# Altium integrated library Integrated_Library.IntLib: 173 symbols (part 1 of 2) (continued)
## TMS320F28335_2 (continued)
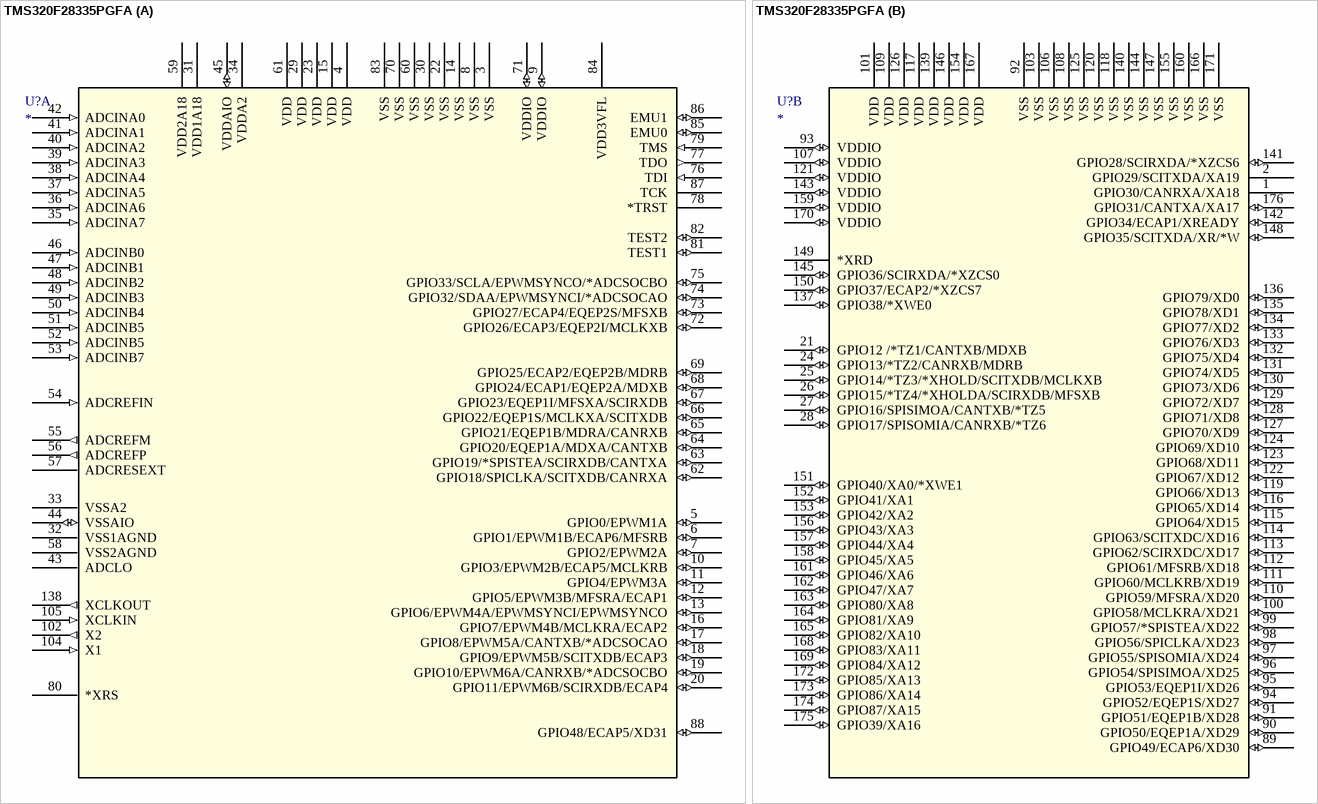
[diagram p13: symbol TMS320F28335PGFA]
text: TMS320F28335

## TMS320F28335PGFA
designator U?
Imported; Manufacturer_Part_Number: TMS320F28335PGFA; Vendor: Texas Instruments; Section: Microcontroller and Processor; C: Copyright (C) 2015 Accelerated Designs. All rights reserved; Family: Microcontroller; Manufacturer_Name: Texas Instruments; Copyright: Copyright (C) 2015 Accelerated Designs. All rights reserved; RS_Part_Number: 6606654; Value: Value; Type: Type; RefDes: RefDes
footprint PGF176
part A pins: 3 VSS (power), 4 VDD (power), 5 GPIO0/EPWM1A (io), 6 GPIO1/EPWM1B/ECAP6/MFSRB (io), 7 GPIO2/EPWM2A (io), 8 VSS (power), 9 VDDIO (io), 10 GPIO3/EPWM2B/ECAP5/MCLKRB (io), 11 GPIO4/EPWM3A (io), 12 GPIO5/EPWM3B/MFSRA/ECAP1 (io), 13 GPIO6/EPWM4A/EPWMSYNCI/EPWMSYNCO (io), 14 VSS (power), 15 VDD (power), 16 GPIO7/EPWM4B/MCLKRA/ECAP2 (io), 17 GPIO8/EPWM5A/CANTXB/*ADCSOCAO (io), 18 GPIO9/EPWM5B/SCITXDB/ECAP3 (io), 19 GPIO10/EPWM6A/CANRXB/*ADCSOCBO (io), 20 GPIO11/EPWM6B/SCIRXDB/ECAP4 (io), 22 VSS (power), 23 VDD (power), 29 VDD (power), 30 VSS (power), 31 VDD1A18 (power), 32 VSS1AGND (power), 33 VSSA2 (power), 34 VDDA2 (power), 35 ADCINA7 (in), 36 ADCINA6 (in), 37 ADCINA5 (in), 38 ADCINA4 (in), 39 ADCINA3 (in), 40 ADCINA2 (in), 41 ADCINA1 (in), 42 ADCINA0 (in), 43 ADCLO, 44 VSSAIO (io), 45 VDDAIO (io), 46 ADCINB0 (in), 47 ADCINB1 (in), 48 ADCINB2 (in), 49 ADCINB3 (in), 50 ADCINB4 (in), 51 ADCINB5 (in), 52 ADCINB5 (in), 53 ADCINB7 (in), 54 ADCREFIN (in), 55 ADCREFM (out), 56 ADCREFP (out), 57 ADCRESEXT, 58 VSS2AGND (power), 59 VDD2A18 (power), 60 VSS (power), 61 VDD (power), 62 GPIO18/SPICLKA/SCITXDB/CANRXA (io), 63 GPIO19/*SPISTEA/SCIRXDB/CANTXA (io), 64 GPIO20/EQEP1A/MDXA/CANTXB (io), 65 GPIO21/EQEP1B/MDRA/CANRXB (io), 66 GPIO22/EQEP1S/MCLKXA/SCITXDB (io), 67 GPIO23/EQEP1I/MFSXA/SCIRXDB (io), 68 GPIO24/ECAP1/EQEP2A/MDXB (io), 69 GPIO25/ECAP2/EQEP2B/MDRB (io), 70 VSS (power), 71 VDDIO (io), 72 GPIO26/ECAP3/EQEP2I/MCLKXB (io), 73 GPIO27/ECAP4/EQEP2S/MFSXB (io), 74 GPIO32/SDAA/EPWMSYNCI/*ADCSOCAO (io), 75 GPIO33/SCLA/EPWMSYNCO/*ADCSOCBO (io), 76 TDI (in), 77 TDO (out), 78 *TRST, 79 TMS (in), 80 *XRS, 81 TEST1 (io), 82 TEST2 (io), 83 VSS (power), 84 VDD3VFL (power), 85 EMU0 (io), 86 EMU1 (io), 87 TCK, 88 GPIO48/ECAP5/XD31 (io), 102 X2 (out), 104 X1 (in), 105 XCLKIN (in), 138 XCLKOUT (out)
part B pins: 1 GPIO30/CANRXA/XA18, 2 GPIO29/SCITXDA/XA19, 21 GPIO12 /*TZ1/CANTXB/MDXB (io), 24 GPIO13/*TZ2/CANRXB/MDRB (io), 25 GPIO14/*TZ3/*XHOLD/SCITXDB/MCLKXB (io), 26 GPIO15/*TZ4/*XHOLDA/SCIRXDB/MFSXB (io), 27 GPIO16/SPISIMOA/CANTXB/*TZ5 (io), 28 GPIO17/SPISOMIA/CANRXB/*TZ6 (io), 89 GPIO49/ECAP6/XD30 (io), 90 GPIO50/EQEP1A/XD29 (io), 91 GPIO51/EQEP1B/XD28 (io), 92 VSS (power), 93 VDDIO (io), 94 GPIO52/EQEP1S/XD27 (io), 95 GPIO53/EQEP1I/XD26 (io), 96 GPIO54/SPISIMOA/XD25 (io), 97 GPIO55/SPISOMIA/XD24 (io), 98 GPIO56/SPICLKA/XD23 (io), 99 GPIO57/*SPISTEA/XD22 (io), 100 GPIO58/MCLKRA/XD21 (io), 101 VDD (power), 103 VSS (power), 106 VSS (power), 107 VDDIO (io), 108 VSS (power), 109 VDD (power), 110 GPIO59/MFSRA/XD20 (io), 111 GPIO60/MCLKRB/XD19 (io), 112 GPIO61/MFSRB/XD18 (io), 113 GPIO62/SCIRXDC/XD17 (io), 114 GPIO63/SCITXDC/XD16 (io), 115 GPIO64/XD15 (io), 116 GPIO65/XD14 (io), 117 VDD (power), 118 VSS (power), 119 GPIO66/XD13 (io), 120 VSS (power), 121 VDDIO (io), 122 GPIO67/XD12 (io), 123 GPIO68/XD11 (io), 124 GPIO69/XD10 (io), 125 VSS (power), 126 VDD (power), 127 GPIO70/XD9 (io), 128 GPIO71/XD8 (io), 129 GPIO72/XD7 (io), 130 GPIO73/XD6 (io), 131 GPIO74/XD5 (io), 132 GPIO75/XD4 (io), 133 GPIO76/XD3 (io), 134 GPIO77/XD2 (io), 135 GPIO78/XD1 (io), 136 GPIO79/XD0 (io), 137 GPIO38/*XWE0 (io), 139 VDD (power), 140 VSS (power), 141 GPIO28/SCIRXDA/*XZCS6 (io), 142 GPIO34/ECAP1/XREADY (io), 143 VDDIO (io), 144 VSS (power), 145 GPIO36/SCIRXDA/*XZCS0 (io), 146 VDD (power), 147 VSS (power), 148 GPIO35/SCITXDA/XR/*W (io), 149 *XRD, 150 GPIO37/ECAP2/*XZCS7 (io), 151 GPIO40/XA0/*XWE1 (io), 152 GPIO41/XA1 (io), 153 GPIO42/XA2 (io), 154 VDD (power), 155 VSS (power), 156 GPIO43/XA3 (io), 157 GPIO44/XA4 (io), 158 GPIO45/XA5 (io), 159 VDDIO (io), 160 VSS (power), 161 GPIO46/XA6 (io), 162 GPIO47/XA7 (io), 163 GPIO80/XA8 (io), 164 GPIO81/XA9 (io), 165 GPIO82/XA10 (io), 166 VSS (power), 167 VDD (power), 168 GPIO83/XA11 (io), 169 GPIO84/XA12 (io), 170 VDDIO (io), 171 VSS (power), 172 GPIO85/XA13 (io), 173 GPIO86/XA14 (io), 174 GPIO87/XA15 (io), 175 GPIO39/XA16 (io), 176 GPIO31/CANTXA/XA17 (io)

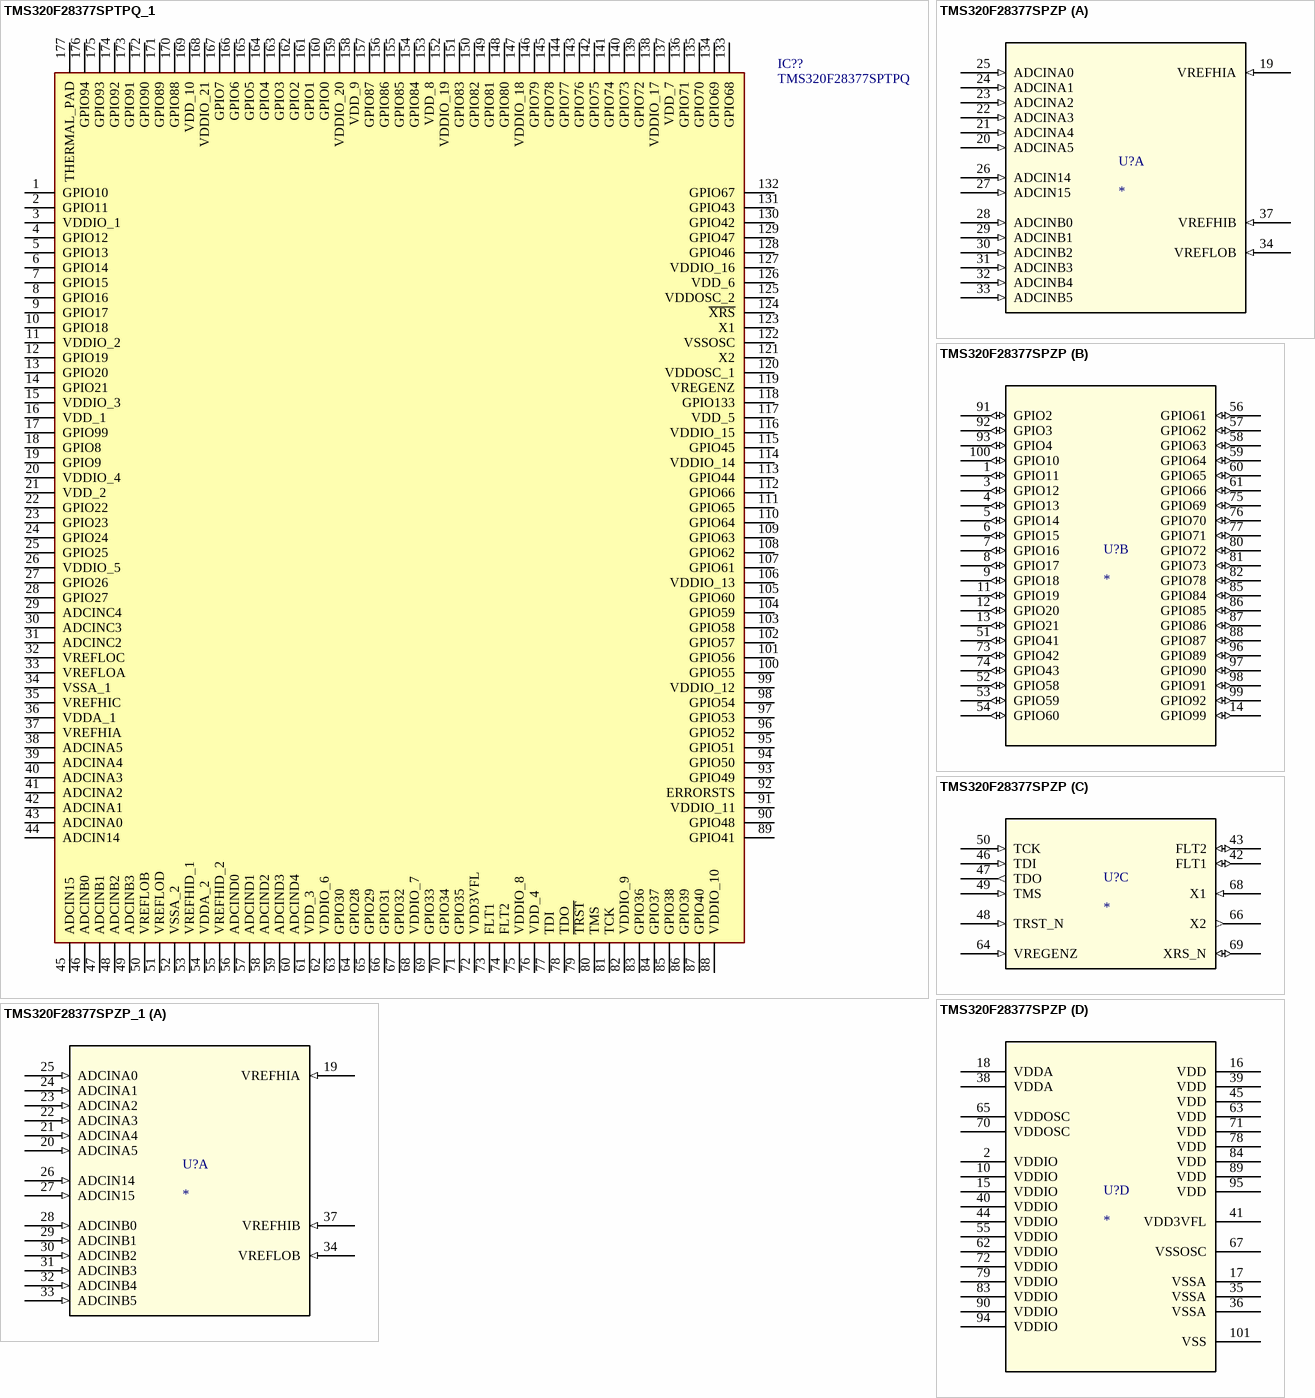
[diagram p14: symbols TMS320F28377SPTPQ_1 to TMS320F28377SPZP_1]

## TMS320F28377SPTPQ_1
designator IC??, comment TMS320F28377SPTPQ
Integrated Circuit; Manufacturer_Name: Texas Instruments; Datasheet Link: http://www.tij.co.jp/jp/lit/ds/symlink/tms320f28377s.pdf; Height: 1.45mm; Mouser2 Part Number: 595-320F28377SPTPQ; Mouser2 Price/Stock: https://www.mouser.com/Search/Refine.aspx?Keyword=595-320F28377SPTPQ; Manufacturer_Part_Number: TMS320F28377SPTPQ
footprint QFP50P2600X2600X145-177N
pins: 1 GPIO10, 2 GPIO11, 3 VDDIO_1, 4 GPIO12, 5 GPIO13, 6 GPIO14, 7 GPIO15, 8 GPIO16, 9 GPIO17, 10 GPIO18, 11 VDDIO_2, 12 GPIO19, 13 GPIO20, 14 GPIO21, 15 VDDIO_3, 16 VDD_1, 17 GPIO99, 18 GPIO8, 19 GPIO9, 20 VDDIO_4, 21 VDD_2, 22 GPIO22, 23 GPIO23, 24 GPIO24, 25 GPIO25, 26 VDDIO_5, 27 GPIO26, 28 GPIO27, 29 ADCINC4, 30 ADCINC3, 31 ADCINC2, 32 VREFLOC, 33 VREFLOA, 34 VSSA_1, 35 VREFHIC, 36 VDDA_1, 37 VREFHIA, 38 ADCINA5, 39 ADCINA4, 40 ADCINA3, 41 ADCINA2, 42 ADCINA1, 43 ADCINA0, 44 ADCIN14, 45 ADCIN15, 46 ADCINB0, 47 ADCINB1, 48 ADCINB2, 49 ADCINB3, 50 VREFLOB, 51 VREFLOD, 52 VSSA_2, 53 VREFHID_1, 54 VDDA_2, 55 VREFHID_2, 56 ADCIND0, 57 ADCIND1, 58 ADCIND2, 59 ADCIND3, 60 ADCIND4, 61 VDD_3, 62 VDDIO_6, 63 GPIO30, 64 GPIO28, 65 GPIO29, 66 GPIO31, 67 GPIO32, 68 VDDIO_7, 69 GPIO33, 70 GPIO34, 71 GPIO35, 72 VDD3VFL, 73 FLT1, 74 FLT2, 75 VDDIO_8, 76 VDD_4, 77 TDI, 78 TDO, 79 ~{TRST}, 80 TMS, 81 TCK, 82 VDDIO_9, 83 GPIO36, 84 GPIO37, 85 GPIO38, 86 GPIO39, 87 GPIO40, 88 VDDIO_10, 89 GPIO41, 90 GPIO48, 91 VDDIO_11, 92 ERRORSTS, 93 GPIO49, 94 GPIO50, 95 GPIO51, 96 GPIO52, 97 GPIO53, 98 GPIO54, 99 VDDIO_12, 100 GPIO55, 101 GPIO56, 102 GPIO57, 103 GPIO58, 104 GPIO59, 105 GPIO60, 106 VDDIO_13, 107 GPIO61, 108 GPIO62, 109 GPIO63, 110 GPIO64, 111 GPIO65, 112 GPIO66, 113 GPIO44, 114 VDDIO_14, 115 GPIO45, 116 VDDIO_15, 117 VDD_5, 118 GPIO133, 119 VREGENZ, 120 VDDOSC_1, 121 X2, 122 VSSOSC, 123 X1, 124 ~{XRS}, 125 VDDOSC_2, 126 VDD_6, 127 VDDIO_16, 128 GPIO46, 129 GPIO47, 130 GPIO42, 131 GPIO43, 132 GPIO67, 133 GPIO68, 134 GPIO69, 135 GPIO70, 136 GPIO71, 137 VDD_7, 138 VDDIO_17, 139 GPIO72, 140 GPIO73, 141 GPIO74, 142 GPIO75, 143 GPIO76, 144 GPIO77, 145 GPIO78, 146 GPIO79, 147 VDDIO_18, 148 GPIO80, 149 GPIO81, 150 GPIO82, 151 GPIO83, 152 VDDIO_19, 153 VDD_8, 154 GPIO84, 155 GPIO85, 156 GPIO86, 157 GPIO87, 158 VDD_9, 159 VDDIO_20, 160 GPIO0, 161 GPIO1, 162 GPIO2, 163 GPIO3, 164 GPIO4, 165 GPIO5, 166 GPIO6, 167 GPIO7, 168 VDDIO_21, 169 VDD_10, 170 GPIO88, 171 GPIO89, 172 GPIO90, 173 GPIO91, 174 GPIO92, 175 GPIO93, 176 GPIO94, 177 THERMAL_PAD

## TMS320F28377SPZP
designator U?
Imported; PartNumber: TMS320F28377SPZPQ; Alternate_PartNumber: TMS320F28377SPZPT; Manufacturer: Texas Instruments; CompType: IC; PIN_COUNT: 101; Application_BuildNumber: *; PackageReference: PZP0100N; MountType: SMT; RoHS: Y; RefDes: RefDes; TYPE: TYPE; Value: Value
footprint TSQFP50P1540X1540X120_HS-101N (TSQFP, 100-Leads, Body 14.00x14.00mm, Pitch 0.50mm, Thermal Pad 8.64x8.64mm, IPC Medium Density)
part A pins: 19 VREFHIA (in), 20 ADCINA5 (in), 21 ADCINA4 (in), 22 ADCINA3 (in), 23 ADCINA2 (in), 24 ADCINA1 (in), 25 ADCINA0 (in), 26 ADCIN14 (in), 27 ADCIN15 (in), 28 ADCINB0 (in), 29 ADCINB1 (in), 30 ADCINB2 (in), 31 ADCINB3 (in), 32 ADCINB4 (in), 33 ADCINB5 (in), 34 VREFLOB (in), 37 VREFHIB (in)
part B pins: 1 GPIO11 (io), 3 GPIO12 (io), 4 GPIO13 (io), 5 GPIO14 (io), 6 GPIO15 (io), 7 GPIO16 (io), 8 GPIO17 (io), 9 GPIO18 (io), 11 GPIO19 (io), 12 GPIO20 (io), 13 GPIO21 (io), 14 GPIO99 (io), 51 GPIO41 (io), 52 GPIO58 (io), 53 GPIO59 (io), 54 GPIO60 (io), 56 GPIO61 (io), 57 GPIO62 (io), 58 GPIO63 (io), 59 GPIO64 (io), 60 GPIO65 (io), 61 GPIO66 (io), 73 GPIO42 (io), 74 GPIO43 (io), 75 GPIO69 (io), 76 GPIO70 (io), 77 GPIO71 (io), 80 GPIO72 (io), 81 GPIO73 (io), 82 GPIO78 (io), 85 GPIO84 (io), 86 GPIO85 (io), 87 GPIO86 (io), 88 GPIO87 (io), 91 GPIO2 (io), 92 GPIO3 (io), 93 GPIO4 (io), 96 GPIO89 (io), 97 GPIO90 (io), 98 GPIO91 (io), 99 GPIO92 (io), 100 GPIO10 (io)
part C pins: 42 FLT1 (io), 43 FLT2 (io), 46 TDI (in), 47 TDO (out), 48 TRST_N (in), 49 TMS (in), 50 TCK (in), 64 VREGENZ (in), 66 X2 (out), 68 X1 (in), 69 XRS_N (io)
part D pins: 2 VDDIO (power), 10 VDDIO (power), 15 VDDIO (power), 16 VDD (power), 17 VSSA (power), 18 VDDA (power), 35 VSSA (power), 36 VSSA (power), 38 VDDA (power), 39 VDD (power), 40 VDDIO (power), 41 VDD3VFL (power), 44 VDDIO (power), 45 VDD (power), 55 VDDIO (power), 62 VDDIO (power), 63 VDD (power), 65 VDDOSC (power), 67 VSSOSC (power), 70 VDDOSC (power), 71 VDD (power), 72 VDDIO (power), 78 VDD (power), 79 VDDIO (power), 83 VDDIO (power), 84 VDD (power), 89 VDD (power), 90 VDDIO (power), 94 VDDIO (power), 95 VDD (power), 101 VSS (power)

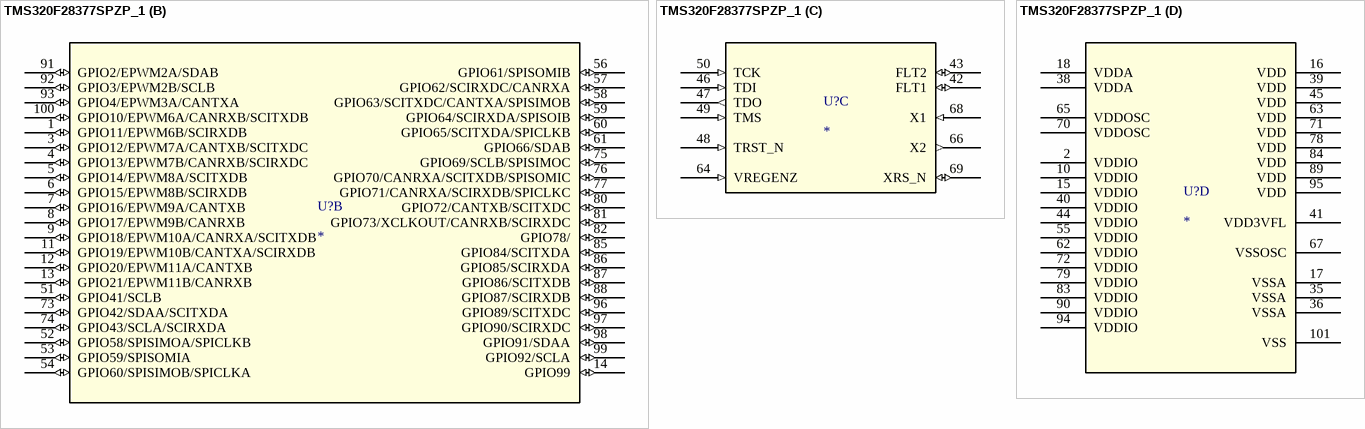
[diagram p15: symbol TMS320F28377SPZP_1]

## TMS320F28377SPZP_1
designator U?
Imported; PartNumber: TMS320F28377SPZPQ; Alternate_PartNumber: TMS320F28377SPZPT; Manufacturer: Texas Instruments; CompType: IC; PIN_COUNT: 101; Application_BuildNumber: *; PackageReference: PZP0100N; MountType: SMT; RoHS: Y; RefDes: RefDes; TYPE: TYPE; Value: Value
footprint TSQFP50P1540X1540X120_HS-101N (TSQFP, 100-Leads, Body 14.00x14.00mm, Pitch 0.50mm, Thermal Pad 8.64x8.64mm, IPC Medium Density)
part A pins: 19 VREFHIA (in), 20 ADCINA5 (in), 21 ADCINA4 (in), 22 ADCINA3 (in), 23 ADCINA2 (in), 24 ADCINA1 (in), 25 ADCINA0 (in), 26 ADCIN14 (in), 27 ADCIN15 (in), 28 ADCINB0 (in), 29 ADCINB1 (in), 30 ADCINB2 (in), 31 ADCINB3 (in), 32 ADCINB4 (in), 33 ADCINB5 (in), 34 VREFLOB (in), 37 VREFHIB (in)
part B pins: 1 GPIO11/EPWM6B/SCIRXDB (io), 3 GPIO12/EPWM7A/CANTXB/SCITXDC (io), 4 GPIO13/EPWM7B/CANRXB/SCIRXDC (io), 5 GPIO14/EPWM8A/SCITXDB (io), 6 GPIO15/EPWM8B/SCIRXDB (io), 7 GPIO16/EPWM9A/CANTXB (io), 8 GPIO17/EPWM9B/CANRXB (io), 9 GPIO18/EPWM10A/CANRXA/SCITXDB (io), 11 GPIO19/EPWM10B/CANTXA/SCIRXDB (io), 12 GPIO20/EPWM11A/CANTXB (io), 13 GPIO21/EPWM11B/CANRXB (io), 14 GPIO99 (io), 51 GPIO41/SCLB (io), 52 GPIO58/SPISIMOA/SPICLKB (io), 53 GPIO59/SPISOMIA (io), 54 GPIO60/SPISIMOB/SPICLKA (io), 56 GPIO61/SPISOMIB (io), 57 GPIO62/SCIRXDC/CANRXA (io), 58 GPIO63/SCITXDC/CANTXA/SPISIMOB (io), 59 GPIO64/SCIRXDA/SPISOIB (io), 60 GPIO65/SCITXDA/SPICLKB (io), 61 GPIO66/SDAB (io), 73 GPIO42/SDAA/SCITXDA (io), 74 GPIO43/SCLA/SCIRXDA (io), 75 GPIO69/SCLB/SPISIMOC (io), 76 GPIO70/CANRXA/SCITXDB/SPISOMIC (io), 77 GPIO71/CANRXA/SCIRXDB/SPICLKC (io), 80 GPIO72/CANTXB/SCITXDC (io), 81 GPIO73/XCLKOUT/CANRXB/SCIRXDC (io), 82 GPIO78/ (io), 85 GPIO84/SCITXDA (io), 86 GPIO85/SCIRXDA (io), 87 GPIO86/SCITXDB (io), 88 GPIO87/SCIRXDB (io), 91 GPIO2/EPWM2A/SDAB (io), 92 GPIO3/EPWM2B/SCLB (io), 93 GPIO4/EPWM3A/CANTXA (io), 96 GPIO89/SCITXDC (io), 97 GPIO90/SCIRXDC (io), 98 GPIO91/SDAA (io), 99 GPIO92/SCLA (io), 100 GPIO10/EPWM6A/CANRXB/SCITXDB (io)
part C pins: 42 FLT1 (io), 43 FLT2 (io), 46 TDI (in), 47 TDO (out), 48 TRST_N (in), 49 TMS (in), 50 TCK (in), 64 VREGENZ (in), 66 X2 (out), 68 X1 (in), 69 XRS_N (io)
part D pins: 2 VDDIO (power), 10 VDDIO (power), 15 VDDIO (power), 16 VDD (power), 17 VSSA (power), 18 VDDA (power), 35 VSSA (power), 36 VSSA (power), 38 VDDA (power), 39 VDD (power), 40 VDDIO (power), 41 VDD3VFL (power), 44 VDDIO (power), 45 VDD (power), 55 VDDIO (power), 62 VDDIO (power), 63 VDD (power), 65 VDDOSC (power), 67 VSSOSC (power), 70 VDDOSC (power), 71 VDD (power), 72 VDDIO (power), 78 VDD (power), 79 VDDIO (power), 83 VDDIO (power), 84 VDD (power), 89 VDD (power), 90 VDDIO (power), 94 VDDIO (power), 95 VDD (power), 101 VSS (power)


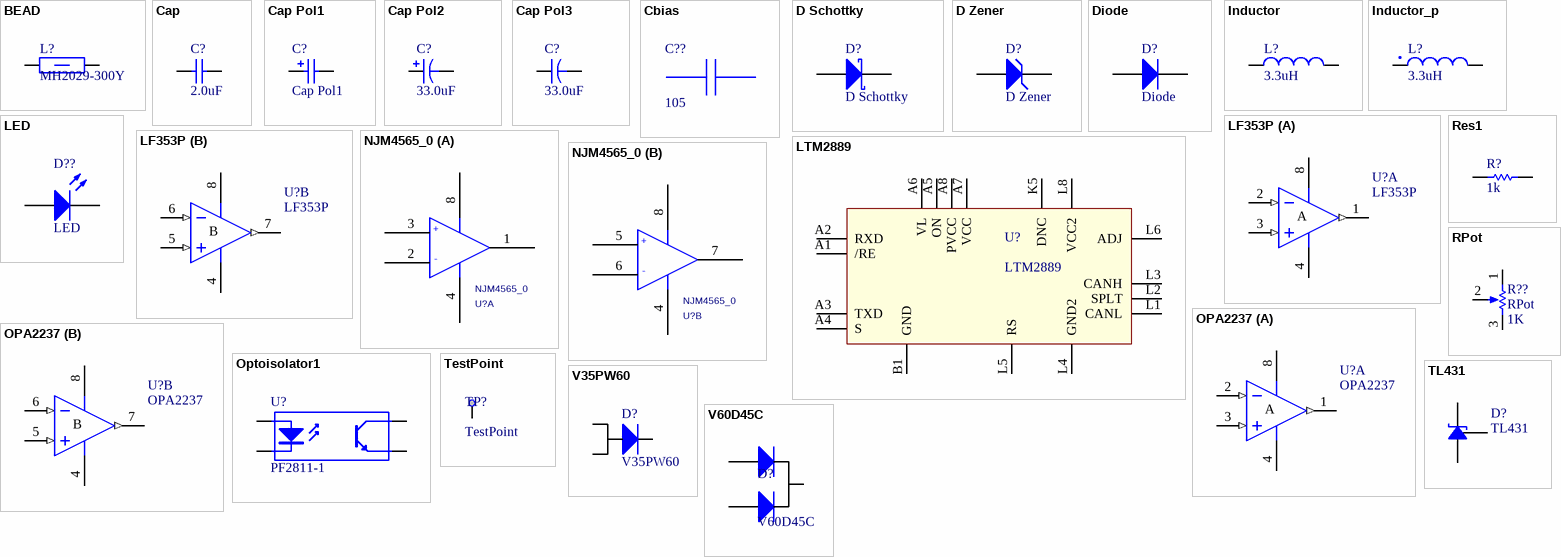
[diagram p16: symbols BEAD to V60D45C]

## BEAD
designator L?, comment MH2029-300Y
Inductor; Manufacturer: Bourns; Par Number: MH2029-300Y
footprint IND2012X05N (Chip Inductor, 2-Leads, Body 2.00x1.20mm, IPC Medium Density)
footprint SF-2923UC (SF-2923UC 5.8x7.3mm Fuse)
pins: 1, 2

## Cap
designator C?, comment 2.0uF
Capacitor; Value: 100pF; Published: 8-Jun-2000; LatestRevisionDate: 17-Jul-2002; LatestRevisionNote: Re-released for DXP Platform.; PackageReference: RAD-0.3; Publisher: Altium Limited; PackageDescription: Radial Cap, Thru-Hole; 2 Leads; 0.3 in Pin Spacing; Part Number: *; Manufacturer: *
footprint RAD-0.3 (Radial Cap, Thru-Hole; 2 Leads; 0.3 in Pin Spacing)
simulation model CAP (Capacitor)
signal-integrity model Cap
footprint CAPC1608X05N (Chip Capacitor, 2-Leads, Body 1.60x0.75mm, IPC Medium Density)
footprint CAPC2012X05N (Chip Capacitor, 2-Leads, Body 2.00x1.20mm, IPC Medium Density)
footprint LDEIH4100KA5N00 (EIA6054-13.7x15.5mmm)
pins: 1, 2

## Cap Pol1
designator C?
Polarized Capacitor (Radial); Value: 100pF; Published: 8-Jun-2000; LatestRevisionDate: 17-Jul-2002; LatestRevisionNote: Re-released for DXP Platform.; PackageReference: RB7.6-15; Publisher: Altium Limited; PackageDescription: Polarized Capacitor (Radial); 2 Leads; Part Number: *; Manufacturer: *
simulation model CAP (Capacitor)
signal-integrity model Cap Pol
footprint CAPMP3216X18N (Molded Capacitor, 2-Leads, Body 3.20x1.60mm, IPC Medium Density)
footprint CAPMP3528X18N (Molded Capacitor, 2-Leads, Body 3.50x2.80mm, IPC Medium Density)
footprint CAPMP6032X25N (Molded Capacitor, 2-Leads, Body 6.00x3.20mm, IPC Medium Density)
pins: 1, 2
1 alternate drawing of the same symbol

## Cap Pol2
designator C?, comment 33.0uF
Polarized Capacitor (Axial); Value: 100pF; Published: 8-Jun-2000; LatestRevisionDate: 17-Jul-2002; LatestRevisionNote: Re-released for DXP Platform.; PackageReference: POLAR0.8; Publisher: Altium Limited; PackageDescription: Polarized Capacitor; 2 Leads; Part Number: *; Manufacturer: *
simulation model CAP (Capacitor)
signal-integrity model Cap Pol
footprint CAPAE9083X100M (Aluminum Electrolytic Capacitor, Body 8.30x8.30x10.00mm, IPC Low Density)
pins: 1, 2
1 alternate drawing of the same symbol

## Cap Pol3
designator C?, comment 33.0uF
Polarized Capacitor (Axial); Value: 100pF; Published: 8-Jun-2000; LatestRevisionDate: 17-Jul-2002; LatestRevisionNote: Re-released for DXP Platform.; PackageReference: POLAR0.8; Publisher: Altium Limited; PackageDescription: Polarized Capacitor; 2 Leads; Part Number: *; Manufacturer: *
simulation model CAP (Capacitor)
signal-integrity model Cap Pol
footprint CAPAE9083X100M (Aluminum Electrolytic Capacitor, Body 8.30x8.30x10.00mm, IPC Low Density)
pins: 1, 2
1 alternate drawing of the same symbol

## Cbias
designator C??, comment 105
LMK212B7105KG-T; Manufacturer Name: Taiyo Yuden; Value: 1uF; PackageReference: LMK212B7105KG-T; Manufacturer Part Number: LMK212B7105KG-T
pins: 1, 2

## D Schottky
designator D?
Schottky Diode; Published: 8-Jun-2000; LatestRevisionDate: 17-Jul-2002; LatestRevisionNote: Re-released for DXP Platform.; PackageReference: SMB; Publisher: Altium Limited; PackageDescription: DO-214-AA/SMB; 2 C-Bend Leads; Body 5.3 x 3.6 mm, inc. leads (LxW); Code_JEDEC: DO-214-AA; Manufacturer: *; Part Number: *
simulation model SKYDIODE (Diode)
signal-integrity model D Schottky
footprint DO-214AC(SMA) (Molded Diode, 2-Leads, Body 4.60x2.70mm, IPC Medium Density)
pins: 1 A, 2 K

## D Zener
designator D?
Zener Diode; Published: 8-Jun-2000; LatestRevisionDate: 17-Jul-2002; LatestRevisionNote: Re-released for DXP Platform.; PackageReference: DIODE-0.7; Publisher: Altium Limited; PackageDescription: Diode, Thru-Hole; 2 Leads; 0.7 in Pin Spacing; Manufacturer: *; Part Number: *
footprint SOD_123-371X110-2N (SODFL, 2-Leads, Body 1.60x3.71mm, IPC Medium Density)
pins: 1 A, 2 K

## Diode
designator D?
Default Diode; Published: 8-Jun-2000; LatestRevisionDate: 17-Jul-2002; LatestRevisionNote: Re-released for DXP Platform.; PackageVersion: Sep-1996; PackageReference: SMC; Publisher: Altium Limited; PackageDescription: DO-214-AB/SMC; 2 C-Bend Leads; Body 7.9 x 5.9 mm, inc. leads (LxW); Code_JEDEC: DO-214-AB; Manufacturer: *; Part Number: *
footprint SMC (DO-214-AB/SMC; 2 C-Bend Leads; Body 7.9 x 5.9 mm, inc. leads (LxW))
simulation model DIODE (Diode)
signal-integrity model Diode
pins: 1 A, 2 K

## Inductor
designator L?, comment 3.3uH
Inductor; Code_IEC: 1005; Value: 10mH; Published: 8-Jun-2000; LatestRevisionDate: 29-May-2009; LatestRevisionNote: IPC-7351 Footprint Added.; PackageReference: 0402-A; Publisher: Altium Limited; PackageDescription: Chip Inductor; Code_JEITA: 0402; Manufacturer: *; Part Number: *
simulation model INDUCTOR (Inductor)
signal-integrity model Inductor
footprint SDR1307
pins: 1, 2

## Inductor_p
designator L?, comment 3.3uH
Inductor; Code_IEC: 1005; Value: 10mH; Published: 8-Jun-2000; LatestRevisionDate: 29-May-2009; LatestRevisionNote: IPC-7351 Footprint Added.; PackageReference: 0402-A; Publisher: Altium Limited; PackageDescription: Chip Inductor; Code_JEITA: 0402; Manufacturer: *; Part Number: *
simulation model INDUCTOR (Inductor)
signal-integrity model Inductor
footprint SDR1307
pins: 1, 2

## LED
designator D??
Typical INFRARED GaAs LED; Published: 8-Jun-2000; LatestRevisionDate: 08-Jul-2005; LatestRevisionNote: Mech Layer 1 removed.; PackageReference: LED-0; Publisher: Altium Limited; PackageDescription: LED; 2 Leads; Manufacturer: *; Part Number: *
footprint LED-1608(Green)
simulation model LED0 (Diode)
footprint LED-1608(red)
footprint LED 2012(GREEN) (LED, 2-Leads, Body 2.00x1.20mm, IPC Medium Density)
footprint LED 2012(RED) (LED, 2-Leads, Body 2.00x1.20mm, IPC Medium Density)
footprint LED 2012(BLUE) (LED, 2-Leads, Body 2.00x1.20mm, IPC Medium Density)
pins: 1 A, 2 K

## LF353P
designator U?
Dual Operational Amplifier; Published: 16-Jan-2001; LatestRevisionDate: 04-Mar-2005; LatestRevisionNote: Stylized 3D Model Added.; DatasheetVersion: Aug-1994; PackageVersion: Jun-1999; PackageReference: P008; Publisher: Altium Limited; PackageDescription: DIP; 8 Leads; Row Spacing 7.62 mm; Pitch 2.54 mm; Code_JEDEC: MO-001-AN; ComponentLink1Description: Manufacturer Link; ComponentLink1URL: http://www.ti.com/; ComponentLink2Description: Datasheet; ComponentLink2URL: http://www-s.ti.com/sc/ds/lf353.pdf
footprint MSOP8 (MSOP, 8-Leads, Body 3.00x3.00mm, Pitch 0.65mm, IPC Medium Density)
pins on every part: 4 V- (power), 8 V+ (power)
part A pins: 1 OUT (out), 2 IN- (in), 3 IN+ (in)
part B pins: 5 IN+ (in), 6 IN- (in), 7 OUT (out)
part A text: A
part B text: B

## LTM2889
designator U?
Manufacturer: Analog Devices; PartNumber: LTM2889CY-3
footprint LTM2889 (1.27mm*1.27mm)
pins: A1 /RE, A2 RXD, A3 TXD, A4 S, A5 ON, A6 VL, A7 VCC, A8 PVCC, B1 GND, K5 DNC, L1 CANL, L2 SPLT, L3 CANH, L4 GND2, L5 RS, L6 ADJ, L8 VCC2

## NJM4565_0
designator U?
OriginalSymbolOrigin: (0,0)
footprint MSOP-8
part A pins: 1 OUT, 2 -IN, 3 +IN, 4 V- (power), 8 V+ (power)
part B pins: 4 V- (power), 5 +IN, 6 -IN, 7 OUT, 8 V+ (power)
part A text: +; -
part B text: +; -

## OPA2237
designator U?
Dual Operational Amplifier; Published: 16-Jan-2001; LatestRevisionDate: 04-Mar-2005; LatestRevisionNote: Stylized 3D Model Added.; DatasheetVersion: Aug-1994; PackageVersion: Jun-1999; PackageReference: P008; Publisher: Altium Limited; PackageDescription: DIP; 8 Leads; Row Spacing 7.62 mm; Pitch 2.54 mm; Code_JEDEC: MO-001-AN; ComponentLink1Description: Manufacturer Link; ComponentLink1URL: http://www.ti.com/; ComponentLink2Description: Datasheet; ComponentLink2URL: http://www-s.ti.com/sc/ds/lf353.pdf
footprint MSOP8 (MSOP, 8-Leads, Body 3.00x3.00mm, Pitch 0.65mm, IPC Medium Density)
pins on every part: 4 V- (power), 8 V+ (power)
part A pins: 1 OUT (out), 2 IN- (in), 3 IN+ (in)
part B pins: 5 IN+ (in), 6 IN- (in), 7 OUT (out)
part A text: A
part B text: B

## Optoisolator1
designator U?, comment PF2811-1
4-Pin Phototransistor Optocoupler; Manufacturer: RENESAA; Part Number: PS2811-1; Published: 24-Mar-1999; LatestRevisionDate: 04-Mar-2005; LatestRevisionNote: Sch pins 3 & 4 Swapped.; DatasheetVersion: Nov-2003; PackageReference: DIP-4; Publisher: Altium Limited
footprint DIP-4 (DIP; 4 Leads; Row Spacing 7.62 mm; Pitch 2.54 mm)
pins: 1 A "Anode", 2 K "Cathode", 3 E "Emitter", 4 C "Collector"

## Res1
designator R?, comment 1k
Resistor; Published: 8-Jun-2000; LatestRevisionDate: 17-Jul-2002; LatestRevisionNote: Re-released for DXP Platform.; PackageReference: AXIAL-0.3; Publisher: Altium Limited; PackageDescription: Axial Device, Thru-Hole; 2 Leads; 0.3 in Pin Spacing; Value: 1k; Manufacturer: *; Part Number: *
footprint AXIAL-0.3 (Axial Device, Thru-Hole; 2 Leads; 0.3 in Pin Spacing)
simulation model RESISTOR (Resistor)
signal-integrity model Res
footprint RESC1608X05N (Chip Resistor, 2-Leads, Body 1.60x0.75mm, IPC Medium Density)
footprint RESC2012X05N (Chip Resistor, 2-Leads, Body 2.00x1.20mm, IPC Medium Density)
footprint RESC3216X05N (Chip Resistor, 2-Leads, Body 3.20x1.60mm, IPC Medium Density)
pins: 1, 2

## RPot
designator R??  value 1K
Potentiometer; Sim Note: Enter the Resistance value and the set point into parameter fields.; Set Position: 0.5; Published: 8-Jun-2000; LatestRevisionDate: 17-Jul-2002; LatestRevisionNote: Re-released for DXP Platform.; PackageReference: VR5; Publisher: Altium Limited; PackageDescription: Variable Resistor, Thru-Hole; 3 Leads
pins: 1 TOP, 2 TAP, 3 BOT
1 alternate drawing of the same symbol

## TestPoint
designator TP?
pins: 1 TP

## TL431
designator D?
Shunt regulator
footprint SOT95P245X110-3N (SOT23, 3-Leads, Body 2.90x2.45mm, Pitch 0.95mm, IPC Medium Density)
pins: 1 Cathode, 2 Ref, 3 Anode

## V35PW60
designator D?
Default Diode; Published: 8-Jun-2000; LatestRevisionDate: 17-Jul-2002; LatestRevisionNote: Re-released for DXP Platform.; PackageVersion: Sep-1996; PackageReference: SMC; Publisher: Altium Limited; PackageDescription: DO-214-AB/SMC; 2 C-Bend Leads; Body 7.9 x 5.9 mm, inc. leads (LxW); Code_JEDEC: DO-214-AB
footprint TO-252AE(SlimDPAK)
simulation model DIODE (Diode)
signal-integrity model Diode
pins: 1 A, 2 A, 3 K

## V60D45C
designator D?
Dual Low-Voltage Trench MOS Barrier Schottky Rectifier; Manufacturer: VISHAY; Published: 8-Jun-2000; LatestRevisionDate: 17-Jul-2002; LatestRevisionNote: Re-released for DXP Platform.; PackageVersion: Sep-1996; PackageReference: SMC; Publisher: Altium Limited; PackageDescription: DO-214-AB/SMC; 2 C-Bend Leads; Body 7.9 x 5.9 mm, inc. leads (LxW); Code_JEDEC: DO-214-AB; ModleNumber: V60D45C
simulation model DIODE (Diode)
signal-integrity model Diode
footprint TO-263AC (SMPD)
pins: 1 A, 2 A, 3 K


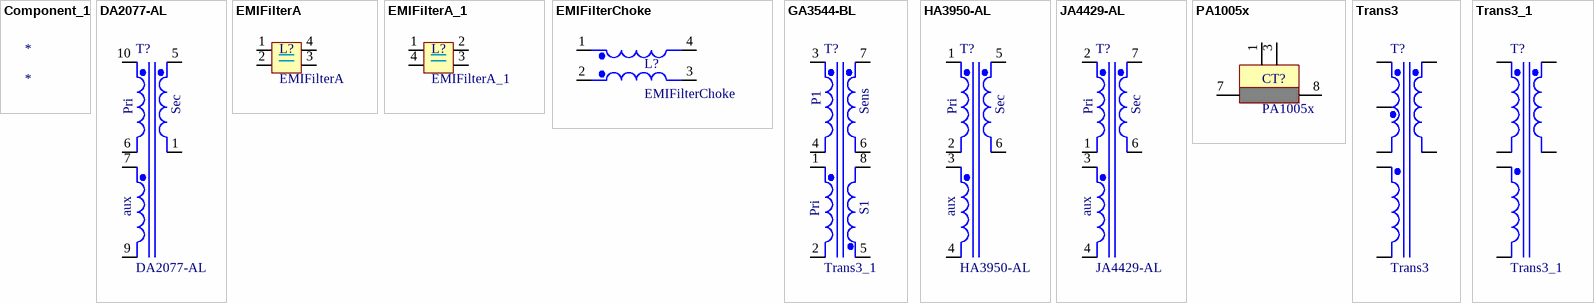
[diagram p17: symbols Component_1 to Trans3_1]

## Component_1
designator *

## DA2077-AL
designator T?
Flyback Transformer; Manufacturer: Coilcraft; Sim Note: Enter the turns ratios, Core loss resistance, Magnetising Reactance, Leakage Reactances and Resistances referred to the primary side into the parameter fields.; Published: 08-Jan-2020; LatestRevisionDate: 17-Jul-2002; LatestRevisionNote: Re-released for DXP Platform.; Publisher: NamiOn; PartNumber: DA2077-AL
footprint DA2077-AL
pins: 1, 5, 6, 7, 9, 10
text: Pri; Sec; aux

## EMIFilterA
designator L?
pins: 1, 2, 3, 4

## EMIFilterA_1
designator L?
pins: 1, 2, 3, 4

## EMIFilterChoke
designator L?
pins: 1, 2, 3, 4

## GA3544-BL
designator T?, comment Trans3_1
Flyback Transformer; Manufacturer: Coilcraft; PartNumber: GA3544-BL; Sim Note: Enter the turns ratios, Core loss resistance, Magnetising Reactance, Leakage Reactances and Resistances referred to the primary side into the parameter fields.; Published: 08-Jan-2020; LatestRevisionDate: 17-Jul-2002; LatestRevisionNote: Re-released for DXP Platform.; Publisher: NamiOn
footprint GA3544-BL
pins: 1, 2, 3, 4, 5, 6, 7, 8
text: P1; Sens; S1; Pri

## HA3950-AL
designator T?
Flyback Transformer; Manufacturer: Coilcraft; Sim Note: Enter the turns ratios, Core loss resistance, Magnetising Reactance, Leakage Reactances and Resistances referred to the primary side into the parameter fields.; Published: 08-Jan-2020; LatestRevisionDate: 17-Jul-2002; LatestRevisionNote: Re-released for DXP Platform.; Publisher: NamiOn; PartNumber: HA3950-AL
footprint HA3950-AL
pins: 1, 2, 3, 4, 5, 6
text: Pri; Sec; aux

## JA4429-AL
designator T?
Flyback Transformer; Manufacturer: Coilcraft; Sim Note: Enter the turns ratios, Core loss resistance, Magnetising Reactance, Leakage Reactances and Resistances referred to the primary side into the parameter fields.; Published: 08-Jan-2020; LatestRevisionDate: 17-Jul-2002; LatestRevisionNote: Re-released for DXP Platform.; Publisher: NamiOn; PartNumber: JA4429-AL
footprint JA4429-AL
pins: 1, 2, 3, 4, 6, 7 6
text: Pri; Sec; aux

## PA1005x
designator CT?
pins: 1, 3, 7, 8

## Trans3
designator T?
Three-winding Transformer (Non-Ideal); Sim Note: Enter the turns ratios, Core loss resistance, Magnetising Reactance, Leakage Reactances and Resistances referred to the primary side into the parameter fields.; Published: 25-Jan-2001; LatestRevisionDate: 17-Jul-2002; LatestRevisionNote: Re-released for DXP Platform.; PackageReference: TRF_6; Publisher: Altium Limited; PackageDescription: Transformer; 6 Leads
footprint DIP10-100mil-400mil
pins: 1 aux+, 2 aux-, 3 Pri+, 4 Pric, 5 Pri-, 7 Sec1-, 9 Sec1+

## Trans3_1
designator T?
Three-winding Transformer; Sim Note: Enter the turns ratios, Core loss resistance, Magnetising Reactance, Leakage Reactances and Resistances referred to the primary side into the parameter fields.; Published: 25-Jan-2001; LatestRevisionDate: 17-Jul-2002; LatestRevisionNote: Re-released for DXP Platform.; PackageReference: TRF_6; Publisher: Altium Limited; PackageDescription: Transformer; 6 Leads
footprint E 16/8/5
pins: 1 Pri+, 2 Pri-, 4 aux-, 4 aux+, 7 Sec1-, 8 Sec1+


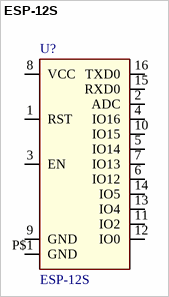
[diagram p18: symbol ESP-12S]

## ESP-12S
designator U?
WiFi 802.11b/g/n Transceiver Module 2.412GHz ~ 2.484GHz PCB Trace Surface Mount; Manufacturer: RF Solutions; Price: None; Availability: Unavailable; PartNumber: ESP-12S; SnapEDA_Link: https://www.snapeda.com/parts/ESP-12S/RF%20Solutions/view-part/3210766/?ref=snap; Value: *; Package: Module RF Solutions
footprint ESP-12S_ESP-12S(Primary)
pins: 1 RST, 2 ADC, 3 EN, 4 IO16, 5 IO14, 6 IO12, 7 IO13, 8 VCC, 9 GND, 10 IO15, 11 IO2, 12 IO0, 13 IO4, 14 IO5, 15 RXD0, 16 TXD0, P$1 GND


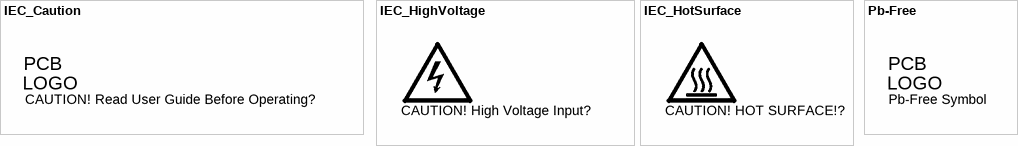
[diagram p19: symbols IEC_Caution to Pb-Free]

## IEC_Caution
designator CAUTION! Read User Guide Before Operating?, comment CAUTION.  READ USER GUIDE BEFORE USE  (value not drawn)  (no BOM)
IEC 61010-1 Caution Warning; SymbolCreator: a0412235; SymbolVersion: 2011-08-22; Published: 2009-03-03; Publisher: Texas Instruments; LatestRevisionDate: 2016-02-04
footprint IEC_Caution_Large
footprint IEC_Caution_Medium
footprint IEC_Caution_Small
text: PCB; LOGO